# Altium footprint library PcbLib.PcbLib: 142 footprints (part 5 of 9)
Each footprint in its own frame and in the unit in brackets; x right, y up, seen from the top. Pads: shape width x height; smd on the part's side, far side on the other; paste and mask are expansions set on the pad; w line width, h text height; cw(c..) or ccw(c..) is an arc to the next point about the centre after c.
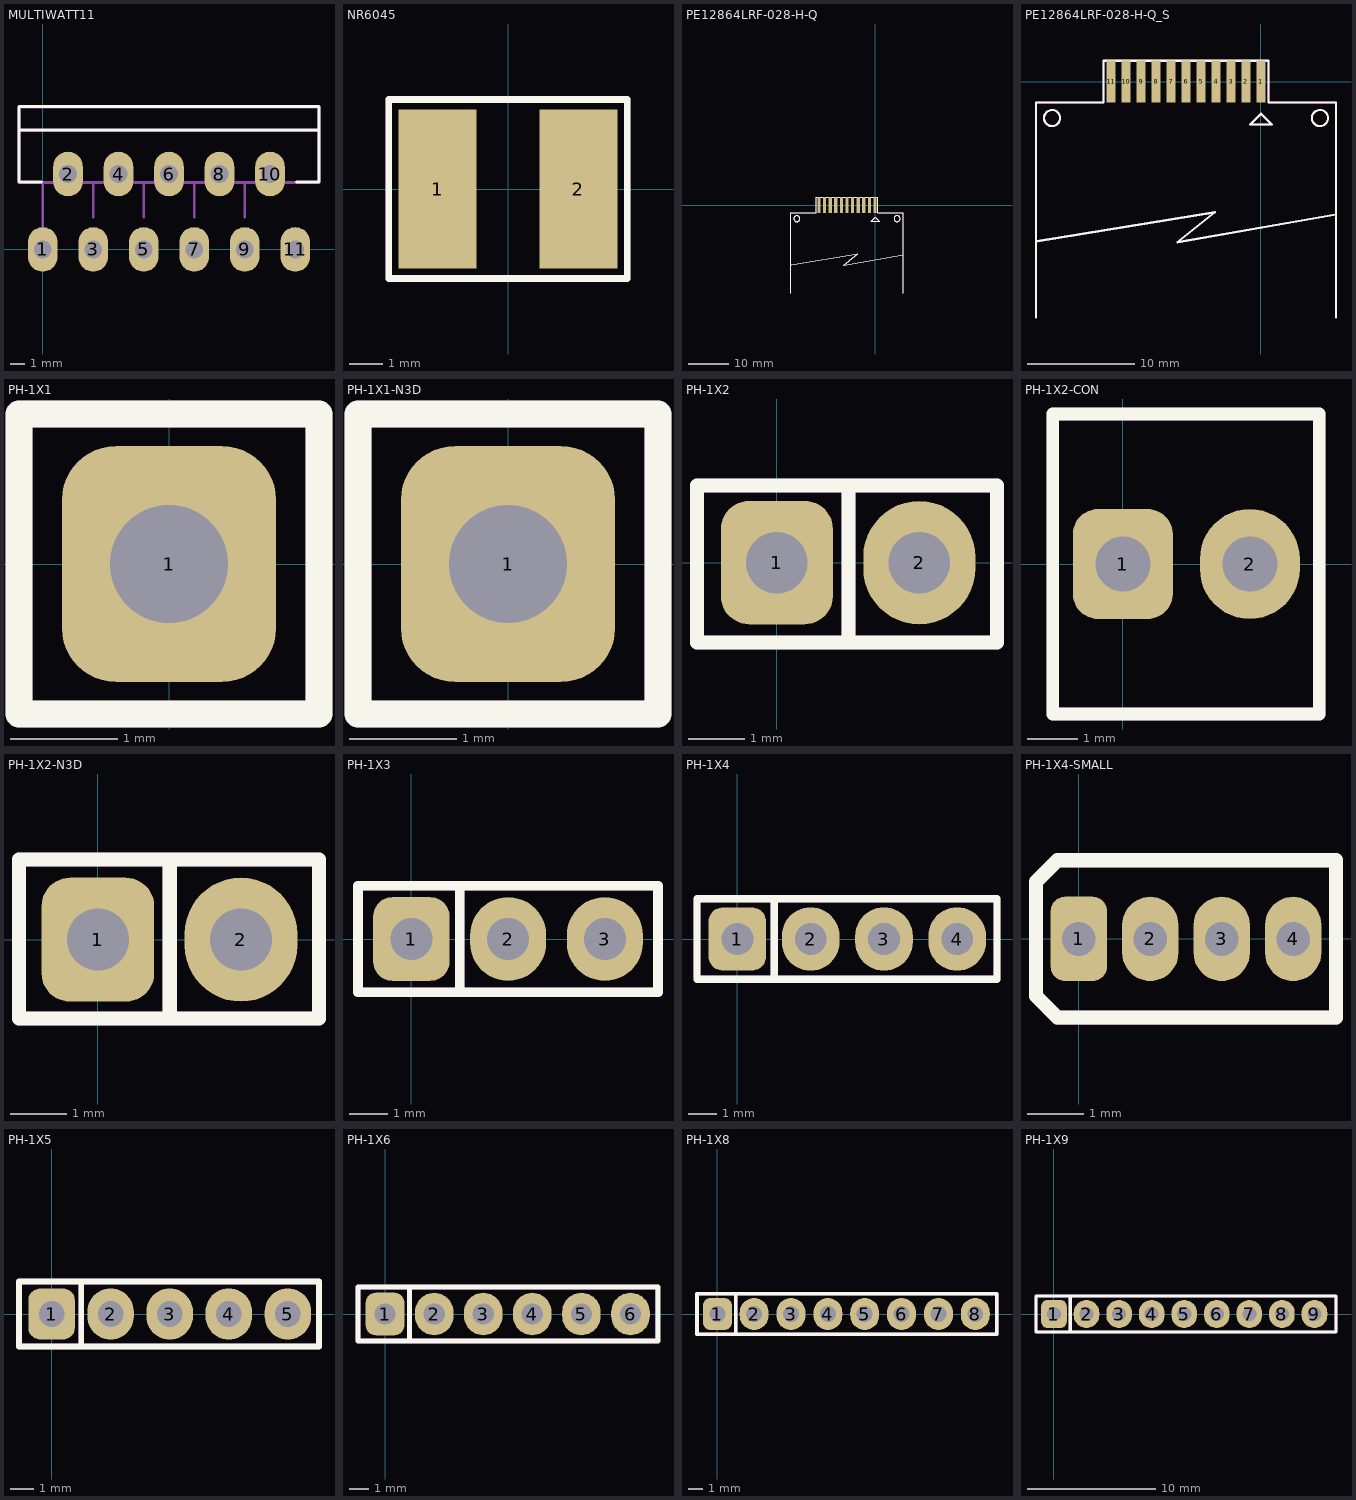
[diagram p4: the footprints below, top view; thin cyan lines are the x and y axes]

## MULTIWATT11 [mm]
pads (11):
  oval 2x3 hole 1.2: 1(0,0) 2(1.7,5.08) 3(3.4,0) 4(5.1,5.08) 5(6.8,0) 6(8.5,5.08) 7(10.2,0) 8(11.9,5.08) 9(13.6,0) 10(15.3,5.08) 11(17,0)
Top Overlay:
  lines w0.2: -1.6,8.04 18.6,8.04 ; -0.1,4.54 -1.6,4.54 -1.6,9.64 18.6,9.64 18.6,4.54 17.1,4.54
Mechanical 29:
  circle w0.254: c0,0 r0.5
  lines w0.2: -1.6,8 18.6,8 ; 0,0.5 0,4.5 ; 3.4,2.2 3.4,4.5 ; 6.8,2.2 6.8,4.5 ; 10.2,2.2 10.2,4.5 ; 13.6,2.2 13.6,4.5 ; -1.6,4.5 -1.6,9.6 18.6,9.6 18.6,4.5 -1.6,4.5
  text ".Designator" at 5.5,6.033 h1
3D body "L6203.STEP": height 23, standoff -2.4, extent -1.6,-0.285 18.6,9.605

## NR6045 [mm]
pads (2):
  rect 2.35x4.8 smd: 1(-2.125,0) 2(2.125,0)
Top Overlay:
  lines w0.2: -3.6,-2.7 3.6,-2.7 3.6,2.7 -3.6,2.7 -3.6,0.2 -3.6,-2.7
Mechanical 29:
  lines w0.2: -3.6,-2.7 3.6,-2.7 3.6,2.7 -3.6,2.7 -3.6,0.2 -3.6,-2.7
  text ".Designator" at -0.8,-0.467 h1
3D body "User Library-SRN6045TA Series.step": height 4.3, standoff 0.1, extent -3,-3 3,3

## PE12864LRF-028-H-Q [mm]
pads (11):
  rect 0.8x3.9 smd: 1(0,0) 2(-1.4,0) 3(-2.8,0) 4(-4.2,0) 5(-5.6,0) 6(-7,0) 7(-8.4,0) 8(-9.8,0) 9(-11.2,0) 10(-12.6,0) 11(-14,0)
Top Overlay:
  circle w0.2: c-19.5,-3.4 r0.75
  circle w0.2: c5.5,-3.4 r0.75
  lines w0.2: -21,-22 -21,-1.95 -14.7,-1.95 -14.7,1.95 0.7,1.95 0.7,-1.95 7,-1.95 7,-22 ; -20.9,-14.9 -4.3,-12.2 -7.8,-15 7,-12.4 ; -1,-4 0,-3 1,-4 -1,-4
Bottom Overlay:
  lines w0.2: -42.35,22.85 -44.4,22.85 -44.4,28.85 -42.3,28.85 ; -42.34,-21.96 -44.294,-21.96 -44.294,-13 -42.3,-13 ; -42.3,-14.85 28.3,-14.85 ; -35.4,28.9 -35.4,32.85 21.4,32.85 21.4,28.9 ; 28.3,-13 30.294,-13 30.294,-21.96 28.34,-21.96 ; 28.35,22.85 30.4,22.85 30.4,28.85 28.3,28.85 ; -42.3,28.85 28.3,28.85 ; -42.3,28.85 -42.3,-24.85 28.3,-24.85 28.3,28.85
  lines w0.254: -38.5,-13 24.5,-13 24.5,27 -38.5,27 -38.5,-13
  text "40x63" at -22.6,22.5 h3
Mechanical 29:
  circle w0.2: c-19.5,-3.4 r0.75
  circle w0.2: c5.5,-3.4 r0.75
  lines w0.2: -21,-22 -21,-1.95 -14.7,-1.95 -14.7,1.95 0.7,1.95 0.7,-1.95 7,-1.95 7,-22 ; -20.9,-14.9 -4.3,-12.2 -7.8,-15 7,-12.4 ; -1,-4 0,-3 1,-4 -1,-4
  text ".Designator" at -10.6,-8.6 h3

## PE12864LRF-028-H-Q_S [mm]
pads (11):
  rect 0.8x3.9 smd: 1(0,0) 2(-1.4,0) 3(-2.8,0) 4(-4.2,0) 5(-5.6,0) 6(-7,0) 7(-8.4,0) 8(-9.8,0) 9(-11.2,0) 10(-12.6,0) 11(-14,0)
Top Overlay:
  circle w0.2: c5.5,-3.4 r0.75
  circle w0.2: c-19.5,-3.4 r0.75
  lines w0.2: -21,-22 -21,-1.95 -14.7,-1.95 -14.7,1.95 0.7,1.95 0.7,-1.95 7,-1.95 7,-22 ; -20.9,-14.9 -4.3,-12.2 -7.8,-15 7,-12.4 ; -1,-4 1,-4 0,-3 -1,-4
Mechanical 29:
  circle w0.2: c5.5,-3.4 r0.75
  circle w0.2: c-19.5,-3.4 r0.75
  lines w0.2: -21,-22 -21,-1.95 -14.7,-1.95 -14.7,1.95 0.7,1.95 0.7,-1.95 7,-1.95 7,-22 ; -20.9,-14.9 -4.3,-12.2 -7.8,-15 7,-12.4 ; -1,-4 1,-4 0,-3 -1,-4
  text ".Designator" at -10.6,-8.6 h3

## PH-1X1 [mm] "2.54mm"
pads (1):
  rrect50% 2x2.2 hole 1.1 mask+0.102: 1(0,0)
Top Overlay:
  lines w0.254: -1.4,-1.4 1.4,-1.4 1.4,1.4 -1.4,1.4 -1.4,-1.4
Mechanical 29:
  lines w0.254: -1.4,-1.4 1.4,-1.4 1.4,1.4 -1.4,1.4 -1.4,-1.4
  text ".Designator" at -0.55,-0.392 h1
3D body "Pin Header 1x1 TH Pitch 2.54mm.stp": height 9.5, standoff -3.2, extent -1.27,-1.27 1.27,1.27

## PH-1X1-N3D [mm] "2.54mm"
pads (1):
  rrect50% 2x2.2 hole 1.1 mask+0.102: 1(0,0)
Top Overlay:
  lines w0.254: -1.4,-1.4 -1.4,1.4 1.4,1.4 1.4,-1.4 -1.4,-1.4
Mechanical 29:
  lines w0.254: -1.4,-1.4 -1.4,1.4 1.4,1.4 1.4,-1.4 -1.4,-1.4
  text ".Designator" at -0.55,-0.392 h1

## PH-1X2 [mm] "2.54mm"
pads (2):
  rrect50% 2x2.2 hole 1.1 mask+0.102: 1(0,0)
  oval 2x2.2 hole 1.1 mask+0.102: 2(2.54,0)
Top Overlay:
  lines w0.254: 1.275,-1.4 1.275,1.35 ; -1.425,-1.425 -1.425,1.375 3.925,1.375 3.925,-1.425 -1.425,-1.425
Mechanical 29:
  lines w0.254: 1.275,-1.4 1.275,1.35 ; -1.425,-1.425 -1.425,1.375 3.925,1.375 3.925,-1.425 -1.425,-1.425
  text ".Designator" at -0.8,-0.467 h1
3D body "Pin Header 1x2 TH Pitch 2.54mm.stp": height 9.5, standoff -3.2, extent -1.29,-1.29 3.79,1.25

## PH-1X2-CON [mm] "2.54mm"
pads (2):
  rrect50% 2x2.2 hole 1.1 mask+0.102: 1(0,0)
  oval 2x2.2 hole 1.1 mask+0.102: 2(2.54,0)
Top Overlay:
  lines w0.254: -1.4,-3 3.925,-3 3.925,3 -1.4,3 -1.4,-3
Mechanical 29:
  lines w0.254: -1.4,-3 3.925,-3 3.925,3 -1.4,3 -1.4,-3
  text ".Designator" at -0.8,-0.467 h1
3D body "User Library-Part1-228.step": height 12.5, standoff -1.5, extent -1.225,-3.025 3.775,2.975

## PH-1X2-N3D [mm] "2.54mm"
pads (2):
  rrect50% 2x2.2 hole 1.1 mask+0.102: 1(0,0)
  oval 2x2.2 hole 1.1 mask+0.102: 2(2.54,0)
Top Overlay:
  lines w0.254: 1.275,-1.4 1.275,1.35 ; -1.4,-1.4 -1.4,1.425 3.925,1.425 3.925,-1.4 -1.4,-1.4
Mechanical 29:
  lines w0.254: 1.275,-1.4 1.275,1.35 ; -1.4,-1.4 -1.4,1.425 3.925,1.425 3.925,-1.4 -1.4,-1.4
  text ".Designator" at -0.8,-0.467 h1

## PH-1X3 [mm] "2.54mm"
pads (3):
  rrect50% 2x2.2 hole 1.1 mask+0.102: 1(0,0)
  oval 2x2.2 hole 1.1 mask+0.102: 2(2.54,0) 3(5.08,0)
Top Overlay:
  lines w0.254: 1.275,-1.4 1.275,1.35 ; -1.4,-1.4 -1.4,1.4 6.475,1.4 6.475,-1.4 -1.4,-1.4
Mechanical 29:
  lines w0.254: 1.275,-1.4 1.275,1.35 ; -1.4,-1.4 6.475,-1.4 6.475,1.4 -1.4,1.4 -1.4,-1.4
  text ".Designator" at 2.2,-0.467 h1
3D body "Pin Header 1x3 TH Pitch 2.54mm.stp": height 9.5, standoff -3.2, extent -1.27,-1.27 6.35,1.27

## PH-1X4 [mm] "2.54mm"
pads (4):
  rrect50% 2x2.2 hole 1.1: 1(0,0)
  oval 2x2.2 hole 1.1 mask+0.102: 2(2.54,0) 3(5.08,0) 4(7.62,0)
Top Overlay:
  lines w0.254: 1.275,-1.4 1.275,1.35 ; -1.4,-1.4 9,-1.4 9,1.4 -1.4,1.4 -1.4,-1.4
Mechanical 29:
  lines w0.254: 1.275,-1.4 1.275,1.35 ; -1.4,-1.4 -1.4,1.4 9,1.4 9,-1.4 -1.4,-1.4
  text ".Designator" at 2.9,-0.467 h1
3D body "Pin Header 1x4 TH Pitch 2.54mm.stp": height 9.5, standoff -3.2, extent -1.27,-1.27 8.89,1.27

## PH-1X4-SMALL [mm] "1.27mm"
pads (4):
  rrect50% 1x1.5 hole 0.6: 1(0,0)
  oval 1x1.5 hole 0.6 mask+0.102: 2(1.27,0) 3(2.54,0) 4(3.81,0)
Top Overlay:
  lines w0.254: -0.762,-1.016 -0.762,1.016 -0.381,1.397 4.572,1.397 4.572,-1.397 -0.381,-1.397 -0.762,-1.016
Mechanical 29:
  lines w0.254: -0.762,-1.016 -0.378,-1.4 4.572,-1.4 4.572,1.397 -0.381,1.397 -0.57,1.208 -0.762,1.016 -0.762,-1.016
  text ".Designator" at -0.308,-0.229 h1
3D body "4-Pin_Header-Male-Single-1.27mm.STEP": height 4.6, standoff -2.6, extent -0.635,-1.25 4.345,1.25

## PH-1X5 [mm] "2.54mm"
pads (5):
  rrect50% 2x2.2 hole 1.1: 1(0,0)
  oval 2x2.2 hole 1.1 mask+0.102: 2(2.54,0) 3(5.08,0) 4(7.62,0) 5(10.16,0)
Top Overlay:
  lines w0.254: 1.275,-1.4 1.275,1.35 ; -1.4,-1.4 -1.4,1.4 11.5,1.4 11.5,-1.4 -1.4,-1.4
Mechanical 29:
  lines w0.254: 1.275,-1.4 1.275,1.35 ; -1.4,-1.4 11.5,-1.4 11.5,1.4 -1.4,1.4 -1.4,-1.4
  text ".Designator" at 3.9,-0.467 h1
3D body "Pin Header 1x5 TH Pitch 2.54mm.stp": height 9.5, standoff -3.2, extent -1.27,-1.27 11.43,1.27

## PH-1X6 [mm] "2.54mm"
pads (6):
  rrect50% 2x2.2 hole 1.1: 1(0,0)
  oval 2x2.2 hole 1.1 mask+0.102: 2(2.54,0) 3(5.08,0) 4(7.62,0) 5(10.16,0) 6(12.7,0)
Top Overlay:
  lines w0.254: 1.275,-1.4 1.275,1.35 ; -1.4,-1.4 14.122,-1.4 14.122,1.4 -1.4,1.4 -1.4,-1.4
Mechanical 29:
  lines w0.254: 1.275,-1.4 1.275,1.35 ; -1.4,-1.4 -1.4,1.4 14.097,1.4 14.097,-1.4 -1.4,-1.4
  text ".Designator" at 3.9,-0.467 h1

## PH-1X8 [mm] "2.54mm"
pads (8):
  rrect50% 2x2.2 hole 1.1: 1(0,0)
  oval 2x2.2 hole 1.1 mask+0.102: 2(2.54,0) 3(5.08,0) 4(7.62,0) 5(10.16,0) 6(12.7,0) 7(15.24,0) 8(17.78,0)
Top Overlay:
  lines w0.254: 1.275,-1.4 1.275,1.35 ; -1.4,-1.4 -1.4,1.4 19.253,1.4 19.253,-1.4 -1.4,-1.4
Mechanical 29:
  lines w0.254: 1.275,-1.4 1.275,1.35 ; -1.4,-1.4 19.279,-1.4 19.279,1.4 -1.4,1.4 -1.4,-1.4
  text ".Designator" at 3.9,-0.467 h1

## PH-1X9 [mm] "2.54mm"
pads (9):
  rrect50% 2x2.2 hole 1.1: 1(0,0)
  oval 2x2.2 hole 1.1 mask+0.102: 2(2.54,0) 3(5.08,0) 4(7.62,0) 5(10.16,0) 6(12.7,0) 7(15.24,0) 8(17.78,0) 9(20.32,0)
Top Overlay:
  lines w0.254: 1.275,-1.4 1.275,1.35 ; -1.4,-1.4 -1.4,1.4 22,1.4 22,-1.4 -1.4,-1.4
Mechanical 29:
  lines w0.254: 1.275,-1.4 1.275,1.35 ; -1.4,-1.4 22,-1.4 22,1.4 -1.4,1.4 -1.4,-1.4
  text ".Designator" at 3.9,-0.467 h1